# Altium footprint library Hydra_Ref_pcb.PcbLib: 353 footprints (part 4 of 23)
Each footprint in its own frame and in the unit in brackets; x right, y up, seen from the top. Pads: shape width x height; smd on the part's side, far side on the other; paste and mask are expansions set on the pad; w line width, h text height; cw(c..) or ccw(c..) is an arc to the next point about the centre after c.
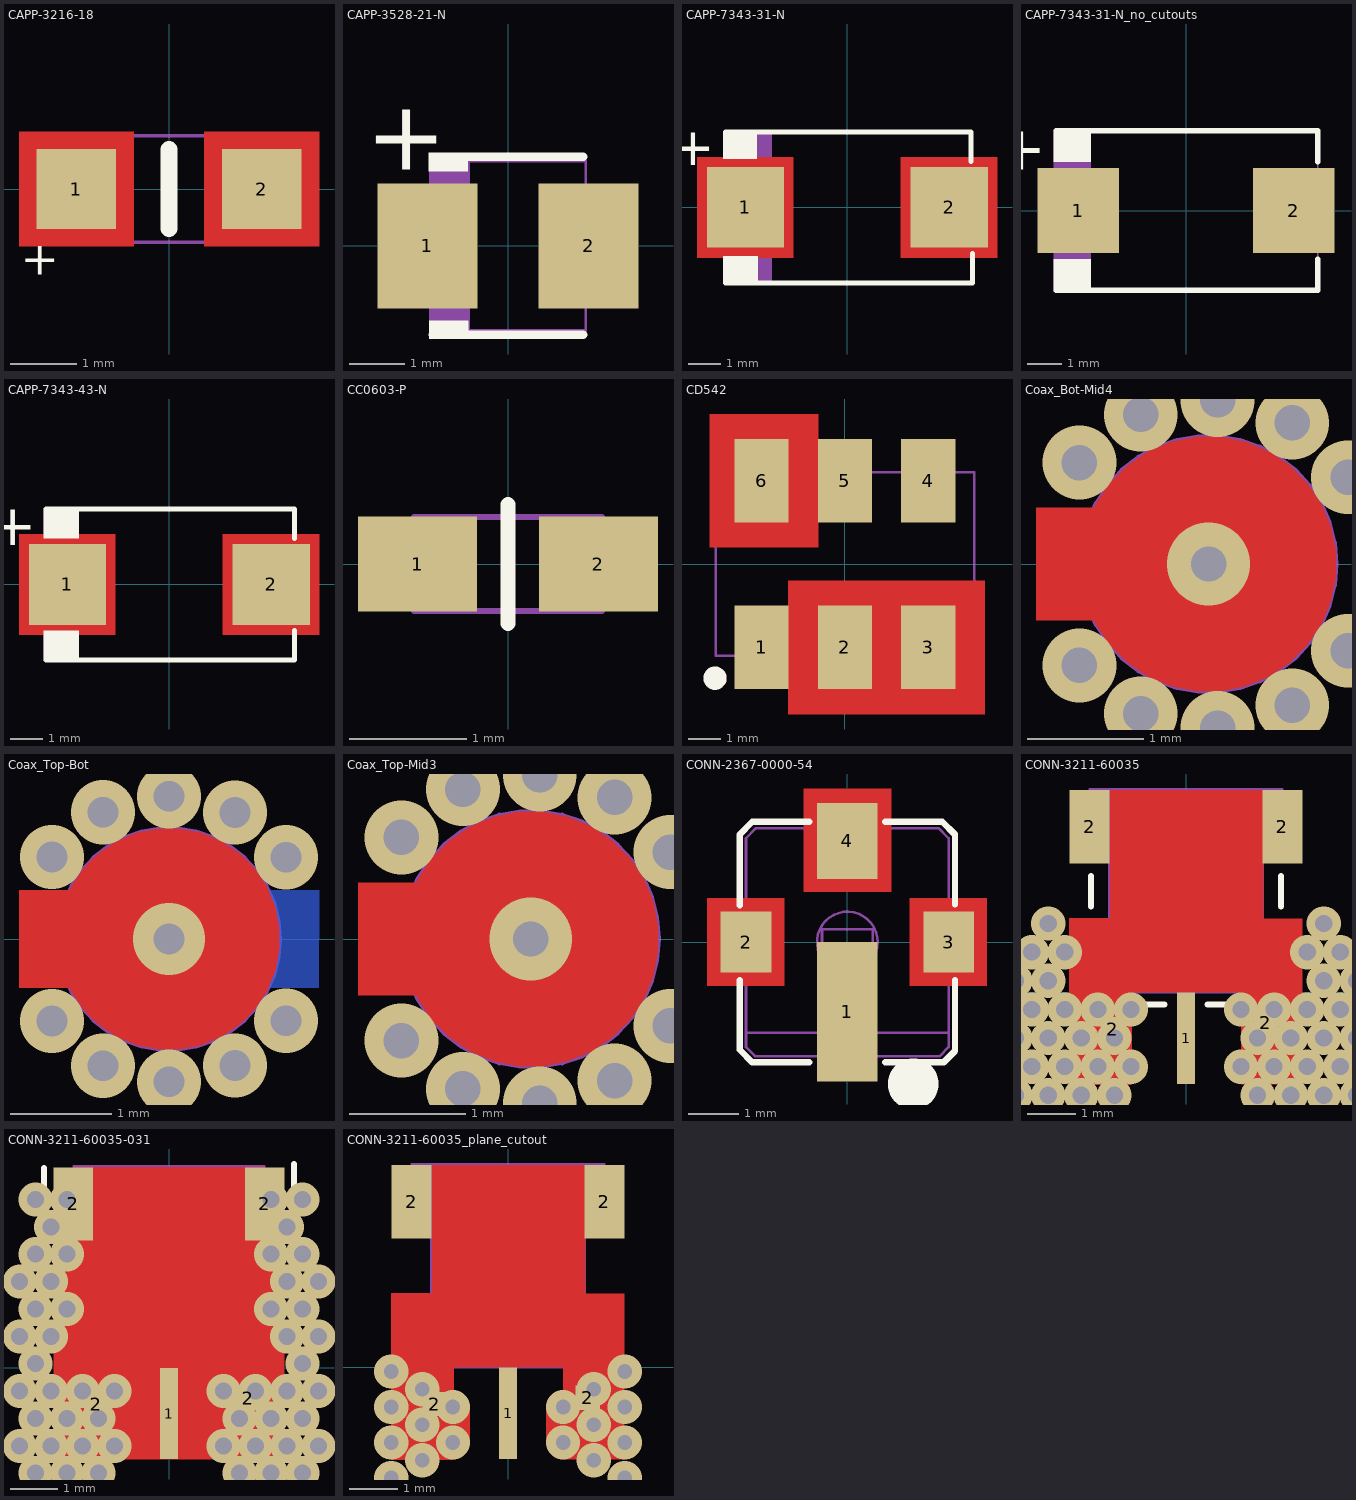
[diagram p3: the footprints below, top view; thin cyan lines are the x and y axes]

## CAPP-3216-18 [mm] "EIA 3216-18"
height 1.6
pads (2):
  rect 1.2x1.2 smd: 1(-1.397,0) 2(1.397,0)
Top Layer:
  pour cut-out: -0.533,0.864 -2.261,0.864 -2.261,-0.864 -0.533,-0.864
  pour cut-out: 2.261,0.864 0.533,0.864 0.533,-0.864 2.261,-0.864
Top Overlay:
  lines w0.254: 0,-0.6 0,0.6
  text "+" at -1.651,-0.864 h0.51
9 Top Assy:
  region: -1.016,0.8 -1.6,0.8 -1.6,-0.8 -1.016,-0.8
  lines w0.051: -1.6,-0.8 1.6,-0.8 1.6,0.8 -1.6,0.8 -1.6,-0.8
  text "+" at -0.457,-0.254 h0.46
  text ".Designator" at -0.889,-0.127 h0.51
3D body: height 1.8, standoff 0, extent -1.6,-0.8 1.6,0.8

## CAPP-3528-21-N [mm] "BsizePolarized Cap 3528-21 EIA Code"
height 2.1
pads (2):
  rect 1.8x2.25 smd: 1(-1.45,0) 2(1.45,0)
Top Overlay:
  rectangle: -1.43,1.34 -0.715,1.675
  rectangle: -1.425,-1.675 -0.71,-1.34
  lines w0.152: -1.35,-1.6 1.35,-1.6 ; -1.35,1.6 1.35,1.6
  text "+" at -1.1,2.45 h1.27
9 Top Assy:
  rectangle: -1.397,-1.54 -0.682,1.524
  lines w0.051: -1.397,-1.524 1.397,-1.524 1.397,1.524 -1.397,1.524 -1.397,-1.524
  text ".Designator" at 0.7,-1.35 h0.76
  text "+" at -1.45,0.55 h1.27
15 Top Optical Placement:
  text "+" at -2.159,-0.381 h0.64
3D body: height 2.1, standoff 0, extent -1.396,-1.523 1.396,1.523

## CAPP-7343-31-N [mm] "DsizePolarized Cap 7343-31 EIA Code"
height 3.099
pads (2):
  rect 2.35x2.45 smd: 1(-3.1,0) 2(3.1,0)
Top Layer:
  pour cut-out: -1.651,1.524 -4.572,1.524 -4.572,-1.524 -1.651,-1.524
  pour cut-out: 4.549,1.524 1.628,1.524 1.628,-1.524 4.549,-1.524
Top Overlay:
  region: -2.718,-1.473 -3.785,-1.473 -3.785,-2.3 -2.718,-2.3
  region: -2.743,2.3 -3.785,2.3 -3.785,1.473 -2.743,1.473
  lines w0.152: -3.708,-2.3 3.8,-2.3 3.8,-1.4 ; -3.708,1.778 -3.708,2.286 3.759,2.286 3.759,1.4
  text "+" at -4.025,2.275 h1.14
9 Top Assy:
  region: -2.286,2.286 -3.759,2.286 -3.759,-2.286 -2.286,-2.286
  lines w0.051: -3.759,-2.286 3.759,-2.286 3.759,2.286 -3.759,2.286 -3.759,-2.286
  text ".Designator" at -1.524,-0.254 h0.89
  text "+" at -3.937,0.559 h1.27
3D body: height 3.1, standoff 0, extent -3.759,-2.3 3.759,2.275

## CAPP-7343-31-N_no_cutouts [mm] "DsizePolarized Cap 7343-31 EIA Code"
height 3.1
pads (2):
  rect 2.35x2.45 smd: 1(-3.1,0) 2(3.1,0)
Top Overlay:
  region: -2.743,2.3 -3.825,2.3 -3.825,1.4 -2.743,1.4
  region: -2.743,-1.4 -3.825,-1.4 -3.825,-2.3 -2.743,-2.3
  lines w0.152: -3.75,-2.3 3.8,-2.3 3.8,-1.4 ; -3.75,2.3 3.8,2.3 3.8,1.4
  text "+" at -4.025,2.275 h1.27
9 Top Assy:
  region: -2.743,2.3 -3.785,2.3 -3.785,-2.272 -2.743,-2.272
  lines w0.051: -3.8,-2.3 -3.8,2.3 3.8,2.3 3.8,-2.3 -3.8,-2.3
  text "+" at -3.937,0.559 h1.27
  text ".Designator" at -2.311,-0.61 h1.52
3D body: height 3.1, standoff 0, extent -4.55,-2.5 4.55,2.6

## CAPP-7343-43-N [mm] "EsizePolarized Cap 7343-43 EIA Code"
height 4.318
pads (2):
  rect 2.35x2.45 smd: 1(-3.1,0) 2(3.1,0)
Top Layer:
  pour cut-out: 4.549,1.524 1.628,1.524 1.628,-1.524 4.549,-1.524
  pour cut-out: -1.651,1.524 -4.572,1.524 -4.572,-1.524 -1.651,-1.524
Top Overlay:
  region: -2.743,2.3 -3.825,2.3 -3.825,1.4 -2.743,1.4
  region: -2.743,-1.4 -3.825,-1.4 -3.825,-2.3 -2.743,-2.3
  lines w0.152: -3.75,-2.3 3.8,-2.3 3.8,-1.4 ; -3.75,2.3 3.8,2.3 3.8,1.4
  text "+" at -4.025,2.275 h1.27
9 Top Assy:
  region: -2.743,2.3 -3.785,2.3 -3.785,-2.272 -2.743,-2.272
  lines w0.051: -3.8,-2.3 -3.8,2.3 3.8,2.3 3.8,-2.3 -3.8,-2.3
  text "+" at -1.245,1.727 h1.27
  text ".Designator" at -2.261,-1.829 h1.52
3D body: height 4.32, standoff 0, extent -4.55,-2.5 4.55,2.6

## CC0603-P [mil] "0603 CHIP CERAMIC CAP; 60(mil)X30(mil)X36(mil)"
height 36
pads (2):
  rect 40x32 smd: 1(-30.35,0) 2(30.35,0)
Top Overlay:
  lines w5: 0,-20 0,20
9 Top Assy:
  lines w2: -31.5,-15.75 31.5,-15.75 31.5,15.75 -31.5,15.75 -31.5,-15.75
  text ".Designator" at -13,-7 h12
3D body: height 36, standoff 0.39, extent -31.5,-15.75 31.5,15.75

## CD542 [mil] "MINI-CIRCUITS MIXER"
height 112
pads (6):
  rect 65x100 smd: 1(-100,-100) 2(0,-100) 3(100,-100) 4(100,100) 5(0,100) 6(-100,100)
Top Layer:
  pour cut-out: -68,-20 -68,-180 168,-180 168,-20
  pour cut-out: -162,180 -162,20 -32,20 -32,180
Top Overlay:
  circle w14: c-156,-137 r7
9 Top Assy:
  circle w14: c-112,-80 r7
  lines w3: -155,-110 -155,110 155,110 155,-110 -155,-110
  text ".Designator" at -70,-15 h25
3D body: height 160, standoff 0.39, extent -155,-110 155,110

## Coax_Bot-Mid4 [mil] "PCB Coaxial Transition"
height 100
via 0,0 diameter 27.98 hole 12
via 47.22,29.35 diameter 24.98 hole 12
via 28.33,47.84 diameter 24.98 hole 12
via 3.04,55.52 diameter 24.98 hole 12
via -22.94,50.65 diameter 24.98 hole 12
via -43.73,34.34 diameter 24.98 hole 12
via -43.73,-34.34 diameter 24.98 hole 12
via -22.94,-50.65 diameter 24.98 hole 12
via 3.04,-55.52 diameter 24.98 hole 12
via 28.33,-47.84 diameter 24.98 hole 12
via 47.22,-29.35 diameter 24.98 hole 12
Top Layer:
  pour cut-out: -30.41,30.41 -33.4,27.41 -38.11,20.37 -41.35,12.54 -43,4.23 -43,-4.24 -41.35,-12.54 -38.11,-20.37 -33.4,-27.41 -30.41,-30.41 -27.41,-33.4 -20.37,-38.11 -12.54,-41.35 -4.24,-43 4.24,-43 12.54,-41.35 20.37,-38.11 27.41,-33.4 30.41,-30.41 33.4,-27.41 38.11,-20.37 41.35,-12.54 43,-4.24 43,4.23 41.35,12.54 38.11,20.37 33.4,27.41 30.41,30.41 27.41,33.4 20.37,38.11 12.54,41.35 4.24,43 -4.24,43 -12.54,41.35 -20.37,38.11 -27.41,33.4
  pour cut-out: -58.41,19 26.24,19 26.24,-19 -58.41,-19
Mid-Layer 1:
  pour cut-out: -30.41,30.41 -33.4,27.41 -38.11,20.37 -41.35,12.54 -43,4.23 -43,-4.24 -41.35,-12.54 -38.11,-20.37 -33.4,-27.41 -30.41,-30.41 -27.41,-33.4 -20.37,-38.11 -12.54,-41.35 -4.24,-43 4.24,-43 12.54,-41.35 20.37,-38.11 27.41,-33.4 30.41,-30.41 33.4,-27.41 38.11,-20.37 41.35,-12.54 43,-4.24 43,4.23 41.35,12.54 38.11,20.37 33.4,27.41 30.41,30.41 27.41,33.4 20.37,38.11 12.54,41.35 4.24,43 -4.24,43 -12.54,41.35 -20.37,38.11 -27.41,33.4
MidLayer3:
  pour cut-out: -30.41,30.41 -33.4,27.41 -38.11,20.37 -41.35,12.54 -43,4.23 -43,-4.24 -41.35,-12.54 -38.11,-20.37 -33.4,-27.41 -30.41,-30.41 -27.41,-33.4 -20.37,-38.11 -12.54,-41.35 -4.24,-43 4.24,-43 12.54,-41.35 20.37,-38.11 27.41,-33.4 30.41,-30.41 33.4,-27.41 38.11,-20.37 41.35,-12.54 43,-4.24 43,4.23 41.35,12.54 38.11,20.37 33.4,27.41 30.41,30.41 27.41,33.4 20.37,38.11 12.54,41.35 4.24,43 -4.24,43 -12.54,41.35 -20.37,38.11 -27.41,33.4
MidLayer2:
  pour cut-out: -30.41,30.41 -33.4,27.41 -38.11,20.37 -41.35,12.54 -43,4.23 -43,-4.24 -41.35,-12.54 -38.11,-20.37 -33.4,-27.41 -30.41,-30.41 -27.41,-33.4 -20.37,-38.11 -12.54,-41.35 -4.24,-43 4.24,-43 12.54,-41.35 20.37,-38.11 27.41,-33.4 30.41,-30.41 33.4,-27.41 38.11,-20.37 41.35,-12.54 43,-4.24 43,4.23 41.35,12.54 38.11,20.37 33.4,27.41 30.41,30.41 27.41,33.4 20.37,38.11 12.54,41.35 4.24,43 -4.24,43 -12.54,41.35 -20.37,38.11 -27.41,33.4
MidLayer4:
  pour cut-out: -30.41,30.41 -33.4,27.41 -38.11,20.37 -41.35,12.54 -43,4.23 -43,-4.24 -41.35,-12.54 -38.11,-20.37 -33.4,-27.41 -30.41,-30.41 -27.41,-33.4 -20.37,-38.11 -12.54,-41.35 -4.24,-43 4.24,-43 12.54,-41.35 20.37,-38.11 27.41,-33.4 30.41,-30.41 33.4,-27.41 38.11,-20.37 41.35,-12.54 43,-4.24 43,4.23 41.35,12.54 38.11,20.37 33.4,27.41 30.41,30.41 27.41,33.4 20.37,38.11 12.54,41.35 4.24,43 -4.24,43 -12.54,41.35 -20.37,38.11 -27.41,33.4
Mid-Layer 5:
  pour cut-out: -30.41,30.41 -33.4,27.41 -38.11,20.37 -41.35,12.54 -43,4.23 -43,-4.24 -41.35,-12.54 -38.11,-20.37 -33.4,-27.41 -30.41,-30.41 -27.41,-33.4 -20.37,-38.11 -12.54,-41.35 -4.24,-43 4.24,-43 12.54,-41.35 20.37,-38.11 27.41,-33.4 30.41,-30.41 33.4,-27.41 38.11,-20.37 41.35,-12.54 43,-4.24 43,4.23 41.35,12.54 38.11,20.37 33.4,27.41 30.41,30.41 27.41,33.4 20.37,38.11 12.54,41.35 4.24,43 -4.24,43 -12.54,41.35 -20.37,38.11 -27.41,33.4
Mid-Layer 6:
  pour cut-out: -30.41,30.41 -33.4,27.41 -38.11,20.37 -41.35,12.54 -43,4.23 -43,-4.24 -41.35,-12.54 -38.11,-20.37 -33.4,-27.41 -30.41,-30.41 -27.41,-33.4 -20.37,-38.11 -12.54,-41.35 -4.24,-43 4.24,-43 12.54,-41.35 20.37,-38.11 27.41,-33.4 30.41,-30.41 33.4,-27.41 38.11,-20.37 41.35,-12.54 43,-4.24 43,4.23 41.35,12.54 38.11,20.37 33.4,27.41 30.41,30.41 27.41,33.4 20.37,38.11 12.54,41.35 4.24,43 -4.24,43 -12.54,41.35 -20.37,38.11 -27.41,33.4
Bottom Layer:
  pour cut-out: -30.41,-30.41 -27.41,-33.4 -20.37,-38.11 -12.54,-41.35 -4.23,-43 4.24,-43 12.54,-41.35 20.37,-38.11 27.41,-33.4 30.41,-30.41 33.4,-27.41 38.11,-20.37 41.35,-12.54 43,-4.23 43,4.24 41.35,12.54 38.11,20.37 33.4,27.41 30.41,30.41 27.41,33.4 20.37,38.11 12.54,41.35 4.24,43 -4.23,43 -12.54,41.35 -20.37,38.11 -27.41,33.4 -30.4,30.41 -33.4,27.41 -38.11,20.37 -41.35,12.54 -43,4.24 -43,-4.23 -41.35,-12.54 -38.11,-20.37 -33.4,-27.41
Top Solder:
  region: -30.41,30.41 -33.4,27.41 -38.11,20.37 -41.35,12.54 -43,4.23 -43,-4.24 -41.35,-12.54 -38.11,-20.37 -33.4,-27.41 -30.41,-30.41 -27.41,-33.4 -20.37,-38.11 -12.54,-41.35 -4.24,-43 4.24,-43 12.54,-41.35 20.37,-38.11 27.41,-33.4 30.41,-30.41 33.4,-27.41 38.11,-20.37 41.35,-12.54 43,-4.24 43,4.23 41.35,12.54 38.11,20.37 33.4,27.41 30.41,30.41 27.41,33.4 20.37,38.11 12.54,41.35 4.24,43 -4.24,43 -12.54,41.35 -20.37,38.11 -27.41,33.4
Bottom Solder:
  region: -30.41,30.41 -33.4,27.41 -38.11,20.37 -41.35,12.54 -43,4.23 -43,-4.24 -41.35,-12.54 -38.11,-20.37 -33.4,-27.41 -30.41,-30.41 -27.41,-33.4 -20.37,-38.11 -12.54,-41.35 -4.24,-43 4.24,-43 12.54,-41.35 20.37,-38.11 27.41,-33.4 30.41,-30.41 33.4,-27.41 38.11,-20.37 41.35,-12.54 43,-4.24 43,4.23 41.35,12.54 38.11,20.37 33.4,27.41 30.41,30.41 27.41,33.4 20.37,38.11 12.54,41.35 4.24,43 -4.24,43 -12.54,41.35 -20.37,38.11 -27.41,33.4
Internal Plane 1:
  circle w0.5: c0,0 r43.15
  region: 0,-43.15 -4.25,-43.15 -12.59,-41.49 -20.44,-38.24 -27.51,-33.52 -33.52,-27.51 -38.24,-20.44 -41.49,-12.59 -43.15,-4.25 -43.15,0 -43.15,4.25 -41.49,12.59 -38.24,20.44 -33.52,27.51 -27.51,33.52 -20.44,38.24 -12.59,41.49 -4.25,43.15 0,43.15 4.25,43.15 12.59,41.49 20.44,38.24 27.51,33.52 33.52,27.51 38.24,20.44 41.49,12.59 43.15,4.25 43.15,0 43.15,-4.25 41.49,-12.59 38.24,-20.44 33.52,-27.51 27.51,-33.52 20.44,-38.24 12.59,-41.49 4.25,-43.15
InternalPlane 3:
  circle w0.5: c0,0 r43.15
  region: 0,-43.15 -4.25,-43.15 -12.59,-41.49 -20.44,-38.24 -27.51,-33.52 -33.52,-27.51 -38.24,-20.44 -41.49,-12.59 -43.15,-4.25 -43.15,0 -43.15,4.25 -41.49,12.59 -38.24,20.44 -33.52,27.51 -27.51,33.52 -20.44,38.24 -12.59,41.49 -4.25,43.15 0,43.15 4.25,43.15 12.59,41.49 20.44,38.24 27.51,33.52 33.52,27.51 38.24,20.44 41.49,12.59 43.15,4.25 43.15,0 43.15,-4.25 41.49,-12.59 38.24,-20.44 33.52,-27.51 27.51,-33.52 20.44,-38.24 12.59,-41.49 4.25,-43.15
Internal Plane 2:
  circle w0.5: c0,0 r28.5
  region: 0,-28.5 -2.81,-28.5 -8.31,-27.4 -13.5,-25.26 -18.17,-22.14 -22.14,-18.17 -25.26,-13.5 -27.4,-8.31 -28.5,-2.81 -28.5,0 -28.5,2.81 -27.4,8.31 -25.26,13.5 -22.14,18.17 -18.17,22.14 -13.5,25.26 -8.31,27.4 -2.81,28.5 0,28.5 2.81,28.5 8.31,27.4 13.5,25.26 18.17,22.14 22.14,18.17 25.26,13.5 27.4,8.31 28.5,2.81 28.5,0 28.5,-2.81 27.4,-8.31 25.26,-13.5 22.14,-18.17 18.17,-22.14 13.5,-25.26 8.31,-27.4 2.81,-28.5
Internal Plane 4:
  circle w0.5: c0,0 r27
  region: 0,-27 -2.66,-27 -7.88,-25.96 -12.79,-23.93 -17.21,-20.97 -20.97,-17.21 -23.93,-12.79 -25.96,-7.88 -27,-2.66 -27,0 -27,2.66 -25.96,7.88 -23.93,12.79 -20.97,17.21 -17.21,20.97 -12.79,23.93 -7.88,25.96 -2.66,27 0,27 2.66,27 7.88,25.96 12.79,23.93 17.21,20.97 20.97,17.21 23.93,12.79 25.96,7.88 27,2.66 27,0 27,-2.66 25.96,-7.88 23.93,-12.79 20.97,-17.21 17.21,-20.97 12.79,-23.93 7.88,-25.96 2.66,-27
9 Top Assy:
  text ".Designator" at -36,-8 h15
13 Top 3D Bodies:
  circle w2: c0,0 r43
Mechanical 30:
  circle w2: c0,0 r43
3D body: height 100, standoff 0, extent -43.37,-43.37 43,43.37
3D body: height 100, standoff 0, extent -42.98,-42.98 42.98,42.98
3D body: height 100, standoff 0, extent -43.37,-43.37 43.37,43.37
3D body: height 100, standoff 0, extent -43.37,-43.37 43.37,43.37

## Coax_Top-Bot [mil] "PCB Coaxial Transition"
height 100
via -45.52,31.92 diameter 24.98 hole 12
via -25.64,49.33 diameter 24.98 hole 12
via 0.04,55.6 diameter 24.98 hole 12
via 25.71,49.3 diameter 24.98 hole 12
via 45.57,31.86 diameter 24.98 hole 12
via 0,0 diameter 27.98 hole 12
via 45.57,-31.86 diameter 24.98 hole 12
via 25.71,-49.3 diameter 24.98 hole 12
via 0.04,-55.6 diameter 24.98 hole 12
via -25.64,-49.33 diameter 24.98 hole 12
via -45.52,-31.92 diameter 24.98 hole 12
Top Layer:
  pour cut-out: -58.41,19 26.24,19 26.24,-19 -58.41,-19
  pour cut-out: -30.41,30.41 -33.4,27.41 -38.11,20.37 -41.35,12.54 -43,4.23 -43,-4.24 -41.35,-12.54 -38.11,-20.37 -33.4,-27.41 -30.41,-30.41 -27.41,-33.4 -20.37,-38.11 -12.54,-41.35 -4.24,-43 4.24,-43 12.54,-41.35 20.37,-38.11 27.41,-33.4 30.41,-30.41 33.4,-27.41 38.11,-20.37 41.35,-12.54 43,-4.24 43,4.23 41.35,12.54 38.11,20.37 33.4,27.41 30.41,30.41 27.41,33.4 20.37,38.11 12.54,41.35 4.24,43 -4.24,43 -12.54,41.35 -20.37,38.11 -27.41,33.4
Mid-Layer 1:
  pour cut-out: -30.41,30.41 -33.4,27.41 -38.11,20.37 -41.35,12.54 -43,4.23 -43,-4.24 -41.35,-12.54 -38.11,-20.37 -33.4,-27.41 -30.41,-30.41 -27.41,-33.4 -20.37,-38.11 -12.54,-41.35 -4.24,-43 4.24,-43 12.54,-41.35 20.37,-38.11 27.41,-33.4 30.41,-30.41 33.4,-27.41 38.11,-20.37 41.35,-12.54 43,-4.24 43,4.23 41.35,12.54 38.11,20.37 33.4,27.41 30.41,30.41 27.41,33.4 20.37,38.11 12.54,41.35 4.24,43 -4.24,43 -12.54,41.35 -20.37,38.11 -27.41,33.4
MidLayer3:
  pour cut-out: -30.41,30.41 -33.4,27.41 -38.11,20.37 -41.35,12.54 -43,4.23 -43,-4.24 -41.35,-12.54 -38.11,-20.37 -33.4,-27.41 -30.41,-30.41 -27.41,-33.4 -20.37,-38.11 -12.54,-41.35 -4.24,-43 4.24,-43 12.54,-41.35 20.37,-38.11 27.41,-33.4 30.41,-30.41 33.4,-27.41 38.11,-20.37 41.35,-12.54 43,-4.24 43,4.23 41.35,12.54 38.11,20.37 33.4,27.41 30.41,30.41 27.41,33.4 20.37,38.11 12.54,41.35 4.24,43 -4.24,43 -12.54,41.35 -20.37,38.11 -27.41,33.4
MidLayer2:
  pour cut-out: -30.41,30.41 -33.4,27.41 -38.11,20.37 -41.35,12.54 -43,4.23 -43,-4.24 -41.35,-12.54 -38.11,-20.37 -33.4,-27.41 -30.41,-30.41 -27.41,-33.4 -20.37,-38.11 -12.54,-41.35 -4.24,-43 4.24,-43 12.54,-41.35 20.37,-38.11 27.41,-33.4 30.41,-30.41 33.4,-27.41 38.11,-20.37 41.35,-12.54 43,-4.24 43,4.23 41.35,12.54 38.11,20.37 33.4,27.41 30.41,30.41 27.41,33.4 20.37,38.11 12.54,41.35 4.24,43 -4.24,43 -12.54,41.35 -20.37,38.11 -27.41,33.4
MidLayer4:
  pour cut-out: -30.41,30.41 -33.4,27.41 -38.11,20.37 -41.35,12.54 -43,4.23 -43,-4.24 -41.35,-12.54 -38.11,-20.37 -33.4,-27.41 -30.41,-30.41 -27.41,-33.4 -20.37,-38.11 -12.54,-41.35 -4.24,-43 4.24,-43 12.54,-41.35 20.37,-38.11 27.41,-33.4 30.41,-30.41 33.4,-27.41 38.11,-20.37 41.35,-12.54 43,-4.24 43,4.23 41.35,12.54 38.11,20.37 33.4,27.41 30.41,30.41 27.41,33.4 20.37,38.11 12.54,41.35 4.24,43 -4.24,43 -12.54,41.35 -20.37,38.11 -27.41,33.4
Mid-Layer 5:
  pour cut-out: -30.41,30.41 -33.4,27.41 -38.11,20.37 -41.35,12.54 -43,4.23 -43,-4.24 -41.35,-12.54 -38.11,-20.37 -33.4,-27.41 -30.41,-30.41 -27.41,-33.4 -20.37,-38.11 -12.54,-41.35 -4.24,-43 4.24,-43 12.54,-41.35 20.37,-38.11 27.41,-33.4 30.41,-30.41 33.4,-27.41 38.11,-20.37 41.35,-12.54 43,-4.24 43,4.23 41.35,12.54 38.11,20.37 33.4,27.41 30.41,30.41 27.41,33.4 20.37,38.11 12.54,41.35 4.24,43 -4.24,43 -12.54,41.35 -20.37,38.11 -27.41,33.4
Mid-Layer 6:
  pour cut-out: -30.41,30.41 -33.4,27.41 -38.11,20.37 -41.35,12.54 -43,4.23 -43,-4.24 -41.35,-12.54 -38.11,-20.37 -33.4,-27.41 -30.41,-30.41 -27.41,-33.4 -20.37,-38.11 -12.54,-41.35 -4.24,-43 4.24,-43 12.54,-41.35 20.37,-38.11 27.41,-33.4 30.41,-30.41 33.4,-27.41 38.11,-20.37 41.35,-12.54 43,-4.24 43,4.23 41.35,12.54 38.11,20.37 33.4,27.41 30.41,30.41 27.41,33.4 20.37,38.11 12.54,41.35 4.24,43 -4.24,43 -12.54,41.35 -20.37,38.11 -27.41,33.4
Bottom Layer:
  pour cut-out: -30.41,-30.41 -27.41,-33.4 -20.37,-38.11 -12.54,-41.35 -4.23,-43 4.24,-43 12.54,-41.35 20.37,-38.11 27.41,-33.4 30.41,-30.41 33.4,-27.41 38.11,-20.37 41.35,-12.54 43,-4.23 43,4.24 41.35,12.54 38.11,20.37 33.4,27.41 30.41,30.41 27.41,33.4 20.37,38.11 12.54,41.35 4.24,43 -4.23,43 -12.54,41.35 -20.37,38.11 -27.41,33.4 -30.4,30.41 -33.4,27.41 -38.11,20.37 -41.35,12.54 -43,4.24 -43,-4.23 -41.35,-12.54 -38.11,-20.37 -33.4,-27.41
  pour cut-out: 58.41,-19 -26.24,-19 -26.24,19 58.41,19
Top Solder:
  region: -30.41,30.41 -33.4,27.41 -38.11,20.37 -41.35,12.54 -43,4.23 -43,-4.24 -41.35,-12.54 -38.11,-20.37 -33.4,-27.41 -30.41,-30.41 -27.41,-33.4 -20.37,-38.11 -12.54,-41.35 -4.24,-43 4.24,-43 12.54,-41.35 20.37,-38.11 27.41,-33.4 30.41,-30.41 33.4,-27.41 38.11,-20.37 41.35,-12.54 43,-4.24 43,4.23 41.35,12.54 38.11,20.37 33.4,27.41 30.41,30.41 27.41,33.4 20.37,38.11 12.54,41.35 4.24,43 -4.24,43 -12.54,41.35 -20.37,38.11 -27.41,33.4
Bottom Solder:
  region: -30.41,30.41 -33.4,27.41 -38.11,20.37 -41.35,12.54 -43,4.23 -43,-4.24 -41.35,-12.54 -38.11,-20.37 -33.4,-27.41 -30.41,-30.41 -27.41,-33.4 -20.37,-38.11 -12.54,-41.35 -4.24,-43 4.24,-43 12.54,-41.35 20.37,-38.11 27.41,-33.4 30.41,-30.41 33.4,-27.41 38.11,-20.37 41.35,-12.54 43,-4.24 43,4.23 41.35,12.54 38.11,20.37 33.4,27.41 30.41,30.41 27.41,33.4 20.37,38.11 12.54,41.35 4.24,43 -4.24,43 -12.54,41.35 -20.37,38.11 -27.41,33.4
Internal Plane 1:
  circle w0.5: c0,0 r28.5
  region: 0,-28.5 -2.81,-28.5 -8.31,-27.4 -13.5,-25.26 -18.17,-22.14 -22.14,-18.17 -25.26,-13.5 -27.4,-8.31 -28.5,-2.81 -28.5,0 -28.5,2.81 -27.4,8.31 -25.26,13.5 -22.14,18.17 -18.17,22.14 -13.5,25.26 -8.31,27.4 -2.81,28.5 0,28.5 2.81,28.5 8.31,27.4 13.5,25.26 18.17,22.14 22.14,18.17 25.26,13.5 27.4,8.31 28.5,2.81 28.5,0 28.5,-2.81 27.4,-8.31 25.26,-13.5 22.14,-18.17 18.17,-22.14 13.5,-25.26 8.31,-27.4 2.81,-28.5
InternalPlane 3:
  circle w0.5: c0,0 r43
  region: 0,-43 -4.24,-43 -12.54,-41.35 -20.37,-38.11 -27.41,-33.4 -33.4,-27.41 -38.11,-20.37 -41.35,-12.54 -43,-4.24 -43,0 -43,4.24 -41.35,12.54 -38.11,20.37 -33.4,27.41 -27.41,33.4 -20.37,38.11 -12.54,41.35 -4.24,43 0,43 4.24,43 12.54,41.35 20.37,38.11 27.41,33.4 33.4,27.41 38.11,20.37 41.35,12.54 43,4.24 43,0 43,-4.24 41.35,-12.54 38.11,-20.37 33.4,-27.41 27.41,-33.4 20.37,-38.11 12.54,-41.35 4.24,-43
Internal Plane 2:
  circle w0.5: c0,0 r43
  region: 0,-43 -4.24,-43 -12.54,-41.35 -20.37,-38.11 -27.41,-33.4 -33.4,-27.41 -38.11,-20.37 -41.35,-12.54 -43,-4.24 -43,0 -43,4.24 -41.35,12.54 -38.11,20.37 -33.4,27.41 -27.41,33.4 -20.37,38.11 -12.54,41.35 -4.24,43 0,43 4.24,43 12.54,41.35 20.37,38.11 27.41,33.4 33.4,27.41 38.11,20.37 41.35,12.54 43,4.24 43,0 43,-4.24 41.35,-12.54 38.11,-20.37 33.4,-27.41 27.41,-33.4 20.37,-38.11 12.54,-41.35 4.24,-43
Internal Plane 4:
  circle w0.5: c0,0 r28.5
  region: 0,-28.5 -2.81,-28.5 -8.31,-27.4 -13.5,-25.26 -18.17,-22.14 -22.14,-18.17 -25.26,-13.5 -27.4,-8.31 -28.5,-2.81 -28.5,0 -28.5,2.81 -27.4,8.31 -25.26,13.5 -22.14,18.17 -18.17,22.14 -13.5,25.26 -8.31,27.4 -2.81,28.5 0,28.5 2.81,28.5 8.31,27.4 13.5,25.26 18.17,22.14 22.14,18.17 25.26,13.5 27.4,8.31 28.5,2.81 28.5,0 28.5,-2.81 27.4,-8.31 25.26,-13.5 22.14,-18.17 18.17,-22.14 13.5,-25.26 8.31,-27.4 2.81,-28.5
9 Top Assy:
  text ".Designator" at -36,-8 h15
13 Top 3D Bodies:
  circle w2: c0,0 r43
Mechanical 30:
  circle w2: c0,0 r43
3D body: height 63, standoff 0, extent -101.5,-101.37 101.5,101.37
